# Altium footprint library xhayqua.PcbLib: 185 footprints (part 10 of 12)
Each footprint in its own frame and in the unit in brackets; x right, y up, seen from the top. Pads: shape width x height; smd on the part's side, far side on the other; paste and mask are expansions set on the pad; w line width, h text height; cw(c..) or ccw(c..) is an arc to the next point about the centre after c.
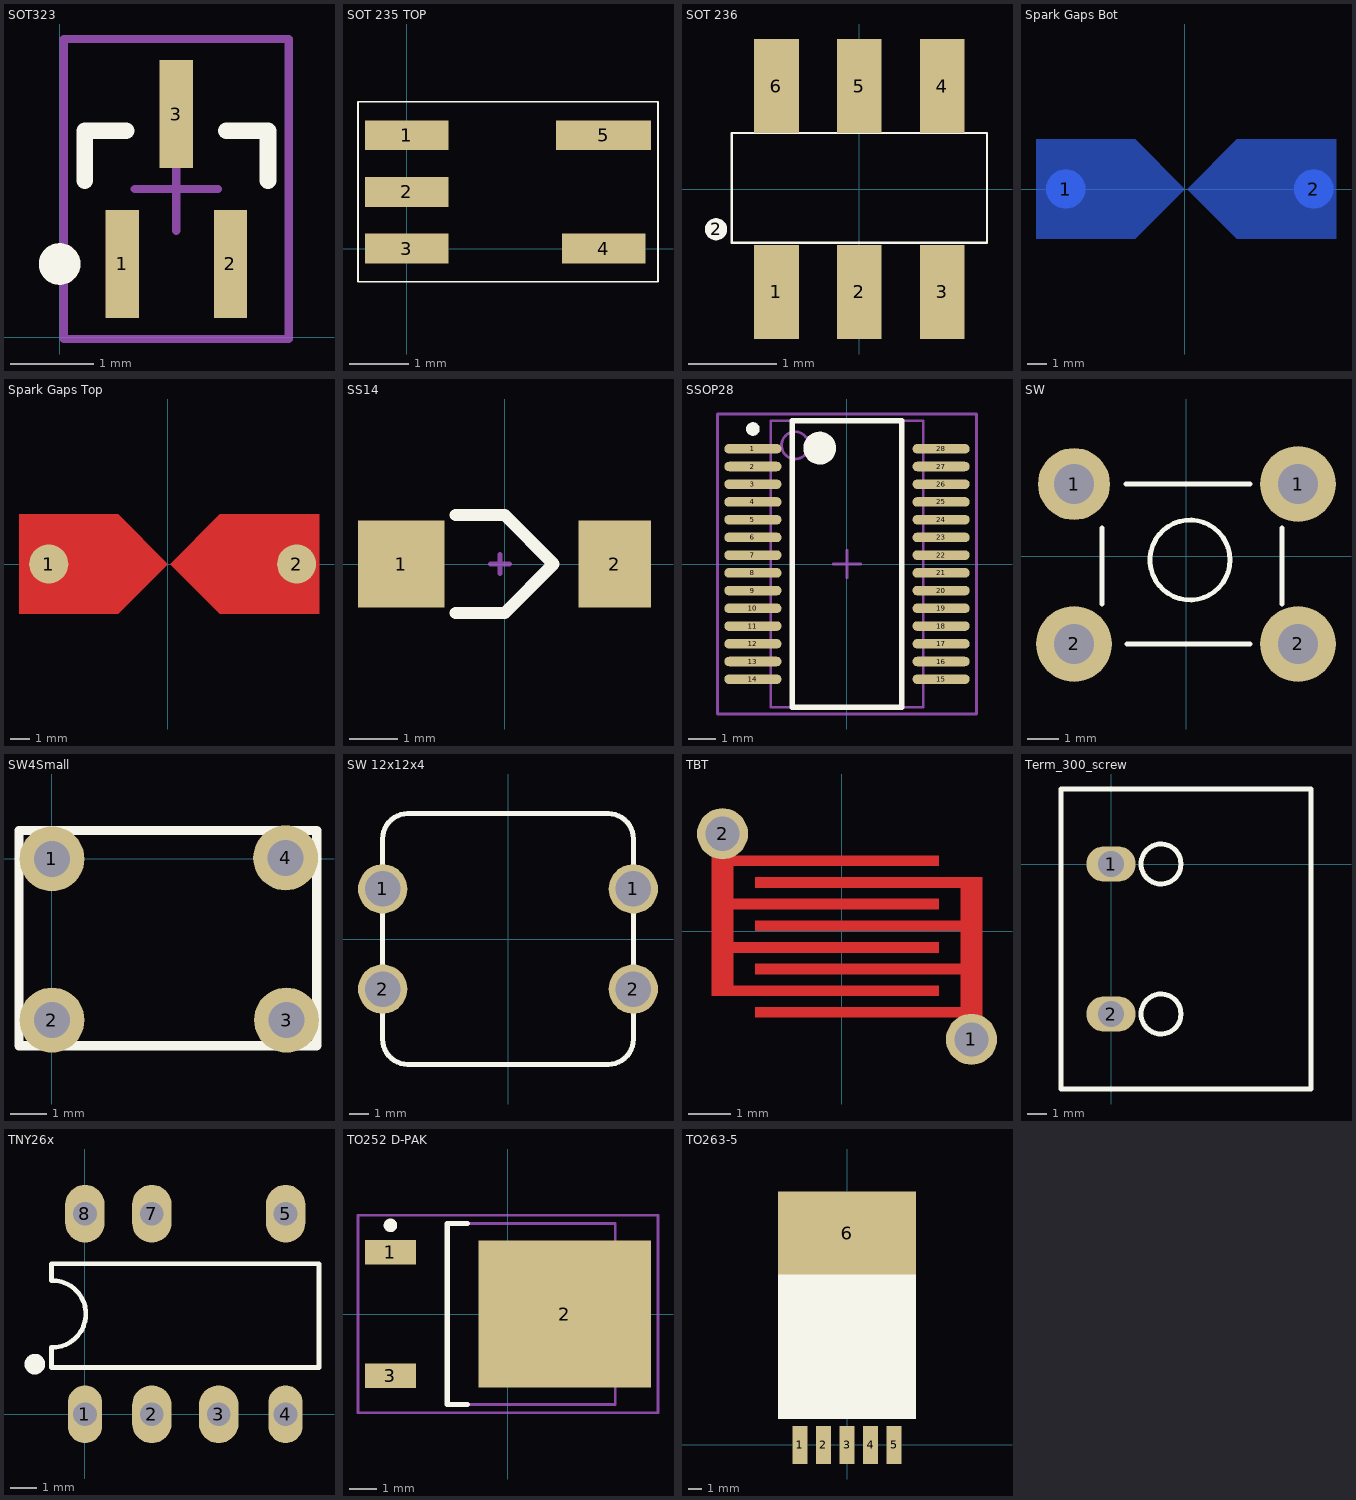
[diagram p9: the footprints below, top view; thin cyan lines are the x and y axes]

## SOT323 [mm] "SOT323 (SC70)"
pads (3):
  rect 0.4x1.3 smd: 1(0.747,0.878) 2(2.047,0.878) 3(1.397,2.678)
Top Overlay:
  circle w0.25: c-0.003,0.878 r0.125
  lines w0.2: 0.297,1.878 0.297,2.478 0.797,2.478 ; 1.997,2.478 2.497,2.478 2.497,1.878
Mechanical 15:
  lines w0.1: 0.897,1.778 1.897,1.778 ; 1.397,1.278 1.397,2.278 ; 0.047,-0.022 0.047,3.578 2.747,3.578 2.747,-0.022 0.047,-0.022
3D body "User Library-SOT323 (SC70-3)-1.STEP": height 1.11, standoff 0.01, extent 0.297,0.63 2.497,2.875

## SOT 235 TOP [mm]
pads (5):
  rect 1.4x0.5 smd: 1(0,1.9) 2(0,0.95) 3(0,0) 4(3.3,0)
  rect 1.6x0.5 smd: 5(3.3,1.9)
Top Overlay:
  lines w0.025: -0.816,-0.559 4.213,-0.559 4.213,2.464 -0.816,2.464 -0.816,-0.559
3D body "SOT23-5-1.step": height 1.3, standoff 0, extent 0.14,-0.561 3.14,2.439

## SOT 236 [mil]
pads (7):
  rect 20x42 smd: 1(-37,-46) 2(0,-46) 3(37,-46) 4(37,46) 5(0,46) 6(-37,46)
  round 10 on Top Overlay: 2(-64,-18)
Top Overlay:
  lines w1: -57,-24 57,-24 57,25 -57,25 -57,-24
3D body "SOT236.step": height 39.37, standoff 0, extent -57.48,-46.06 57.48,46.07

## Spark Gaps Bot [mm]
pads (2):
  round 2 smd far side: 1(-6.096,0) 2(6.604,0)
Bottom Layer:
  region: -7.62,-2.54 -7.62,2.54 -2.54,2.54 0,0 -2.54,-2.54
  region: 0.127,0 2.667,-2.54 7.747,-2.54 7.747,2.54 2.667,2.54

## Spark Gaps Top [mm]
pads (2):
  round 2 smd: 1(-6.096,0) 2(6.604,0)
Top Layer:
  region: -7.62,-2.54 -7.62,2.54 -2.54,2.54 0,0 -2.54,-2.54
  region: 0.127,0 2.667,-2.54 7.747,-2.54 7.747,2.54 2.667,2.54

## SparkGaps [mm]

## SS14 [mm] "Diode"
pads (2):
  rect 1.8x1.8 smd: 1(-2.15,0)
  rect 1.5x1.8 smd: 2(2.286,0)
Top Overlay:
  lines w0.254: -1.016,-1.016 0,-1.016 1.016,0 0,1.016 -1.016,1.016
Mechanical 1:
  lines w0.1: -0.3,0 0.1,0 ; -0.1,-0.2 -0.1,0.2

## SSOP28 [mm]
height 3
pads (28):
  oval 2.1x0.35 smd: 1(-3.45,4.225) 2(-3.45,3.575) 3(-3.45,2.925) 4(-3.45,2.275) 5(-3.45,1.625) 6(-3.45,0.975) 7(-3.45,0.325) 8(-3.45,-0.325) 9(-3.45,-0.975) 10(-3.45,-1.625) 11(-3.45,-2.275) 12(-3.45,-2.925) 13(-3.45,-3.575) 14(-3.45,-4.225) 15(3.45,-4.225) 16(3.45,-3.575) 17(3.45,-2.925) 18(3.45,-2.275) 19(3.45,-1.625) 20(3.45,-0.975) 21(3.45,-0.325) 22(3.45,0.325) 23(3.45,0.975) 24(3.45,1.625) 25(3.45,2.275) 26(3.45,2.925) 27(3.45,3.575) 28(3.45,4.225)
Top Overlay:
  circle w0.6: c-1,4.25 r0.3
  circle w0.25: c-3.45,4.95 r0.125
  lines w0.2: -2,-5.25 2,-5.25 2,5.25 -2,5.25 -2,-5.25
Mechanical 13:
  circle w0.1: c-1.9,4.35 r0.5
  lines w0.1: -2.8,-5.25 2.8,-5.25 2.8,5.25 -2.8,5.25 -2.8,-5.25
Mechanical 15:
  lines w0.1: -0.5,0 0.5,0 ; 0,-0.5 0,0.5 ; -4.75,-5.5 4.75,-5.5 4.75,5.5 -4.75,5.5 -4.75,-5.5
3D body: height 2, standoff 0.05, extent -2.8,-5.25 2.8,5.25

## SW [mil] "6.25x6.25mm"
height 196.85
pads (4):
  round 90 hole 50: 1(-140,90)
  round 95 hole 50: 1(140,90) 2(-140,-110) 2(140,-110)
Top Overlay:
  circle w6: c5,-5 r50
  lines w6: -105,-60 -105,35 ; -75,90 80,90 ; -74,-110 80,-110 ; 120,-60 120,35
  lines w7: 119,-125 120,-124
3D body "SW3dPS-.STEP": height 275.59, standoff -137.8, extent -155.51,-130 155.51,114.09

## SW4Small [mm]
pads (4):
  round 1.8 hole 1: 1(0,0) 2(0,-4.47) 3(6.502,-4.47) 4(6.477,0.025)
Top Overlay:
  lines w0.254: -0.914,-5.182 -0.914,0.787 6.934,0.787 7.341,0.787 7.341,-5.182 -0.914,-5.182
3D body "User Library-Button-small-4pin.step": height 9.52, standoff -3.48, extent -0.864,-5.235 7.348,0.765

## SW 12x12x4 [mm] "Nut bam 12x12x4mm"
pads (4):
  round 2.5 hole 1.8: 1(-6.35,2.54) 1(6.35,2.54) 2(-6.35,-2.54) 2(6.35,-2.54)
Top Overlay:
  lines w0.254: -6.35,-3.81 -6.35,-5.08 ccw(c-5.08,-5.08) -5.08,-6.35 5.08,-6.35 ccw(c5.08,-5.08) 6.35,-5.08 6.35,-3.81 ; -6.35,-1.27 -6.35,1.27 ; -6.35,3.81 -6.35,5.08 cw(c-5.08,5.08) -5.08,6.35 5.08,6.35 cw(c5.08,5.08) 6.35,5.08 6.35,3.81 ; 6.35,-1.27 6.35,1.27
3D body "User Library-tact switch 12x12x8mm.step": height 8.5, standoff -3.5, extent -6.935,-6 6.935,6

## TBT [mm]
pads (2):
  round 1.2 hole 0.8: 1(3.048,-2.54) 2(-2.794,2.286)
Top Layer:
  rectangle: -2.54,1.524 2.286,1.778
  rectangle: -2.032,1.016 2.794,1.27
  rectangle: -2.032,0 2.794,0.254
  rectangle: -2.54,0.508 2.286,0.762
  rectangle: -2.032,-1.016 2.794,-0.762
  rectangle: -2.54,-0.508 2.286,-0.254
  rectangle: -2.032,-2.032 2.794,-1.778
  rectangle: -2.54,-1.524 2.286,-1.27
  rectangle: -3.048,-1.524 -2.54,2.286
  rectangle: 2.794,-2.54 3.302,1.27
Top Solder:
  region: -3,-0.254 -3,-0.451 -2.949,-0.841 -2.847,-1.22 -2.696,-1.584 -2.5,-1.924 -2.26,-2.236 -1.982,-2.514 -1.67,-2.754 -1.33,-2.95 -0.966,-3.101 -0.587,-3.203 -0.197,-3.254 0,-3.254 0.197,-3.254 0.587,-3.203 0.966,-3.101 1.33,-2.95 1.67,-2.754 1.982,-2.514 2.26,-2.236 2.5,-1.924 2.696,-1.584 2.847,-1.22 2.949,-0.841 3,-0.451 3,-0.254 3,-0.057 2.949,0.333 2.847,0.712 2.696,1.076 2.5,1.416 2.26,1.728 1.982,2.006 1.67,2.246 1.33,2.442 0.966,2.593 0.587,2.695 0.197,2.746 0,2.746 -0.197,2.746 -0.587,2.695 -0.966,2.593 -1.33,2.442 -1.67,2.246 -1.982,2.006 -2.26,1.728 -2.5,1.416 -2.696,1.076 -2.847,0.712 -2.949,0.333 -3,-0.057

## Term_300_screw [mm]
height 7.62
pads (2):
  oval 2.5x1.8 hole 1.3: 1(0,0) 2(0,-7.62)
Top Overlay:
  circle w0.254: c2.54,-7.62 r1.016
  circle w0.254: c2.54,0 r1.016
  lines w0.254: -2.54,-11.43 -2.54,3.81 10.16,3.81 10.16,-11.43 -2.54,-11.43

## TNY26x [mm]
pads (7):
  oval 1.3x2.2 hole 0.9: 1(0,0) 4(7.62,0)
  oval 1.5x2.2 hole 0.9: 2(2.54,0) 3(5.08,0) 5(7.62,7.62) 7(2.54,7.62) 8(0,7.62)
Top Overlay:
  circle w0.381: c-1.905,1.905 r0.203
  lines w0.178: -1.28,2.541 ccw(c-1.237,3.81) -1.27,5.08 ; -1.27,2.54 -1.27,1.778 8.89,1.778 8.89,5.715 -1.27,5.715 -1.27,5.105
3D body "SW3dPS-DIP8-CER.STEP": height 5.11, standoff -3.29, extent -1.27,-1.016 8.89,8.545

## TO252 D-PAK [mm]
pads (3):
  rect 1.9x0.9 smd: 1(-4.35,2.28) 3(-4.35,-2.28)
  rect 6.4x5.45 smd: 2(2.1,0)
Top Overlay:
  circle w0.25: c-4.35,3.28 r0.125
  lines w0.2: -1.5,-3.35 -2.25,-3.35 -2.25,3.35 -1.5,3.35
Mechanical 13:
  lines w0.1: -2.25,-3.35 -2.25,3.35 3.97,3.35 3.97,-3.35 -2.25,-3.35
Mechanical 15:
  lines w0.1: -0.5,0 0.5,0 ; 0,-0.5 0,0.5 ; -5.55,-3.65 -5.55,3.65 5.55,3.65 5.55,-3.65 -5.55,-3.65
3D body "User Library-DPAK_TO-252AA.step": height 2.38, standoff -0.02, extent -5.182,-3.367 4.918,3.367

## TO263-5 [mm]
pads (6):
  rect 1.07x2.75 smd: 1(-3.4,0) 2(-1.7,0) 3(0,0) 4(1.7,0) 5(3.4,0)
  rect 10x6 smd: 6(0,15.314)
Top Overlay:
  rectangle: -5,1.88 5,12.903
3D body "SW3dPS-TO263-5.STEP": height 4.79, standoff -0.01, extent -5,-0.356 5,15.314